# Altium footprint library EwgPassive.pcblib: 60 footprints (part 3 of 4)
Each footprint in its own frame and in the unit in brackets; x right, y up, seen from the top. Pads: shape width x height; smd on the part's side, far side on the other; paste and mask are expansions set on the pad; w line width, h text height; cw(c..) or ccw(c..) is an arc to the next point about the centre after c.
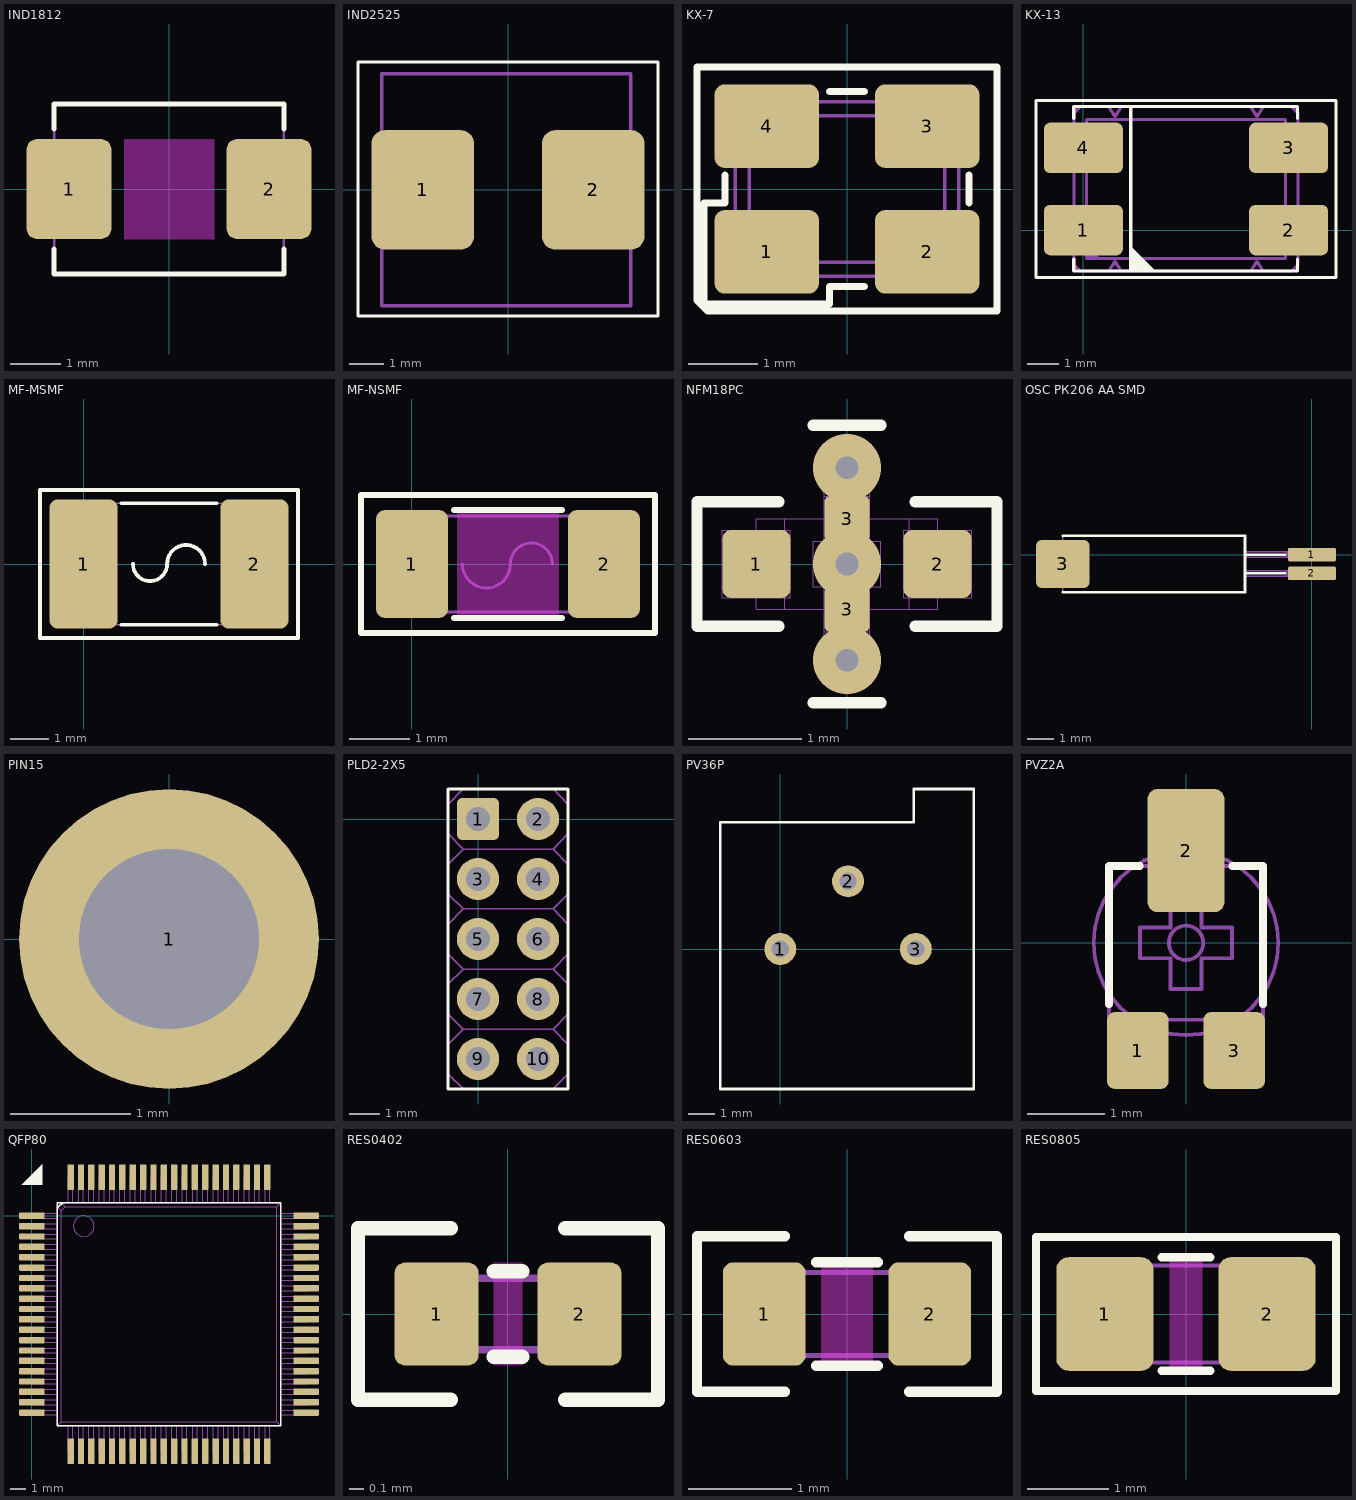
[diagram p2: the footprints below, top view; thin cyan lines are the x and y axes]

## IND1812 [mm]
pads (2):
  rrect25% 1.7x2 smd: 1(-2,0) 2(2,0)
Top Layer keep-out:
  region: -0.9,-1 0.9,-1 0.9,1 -0.9,1
Top Overlay:
  lines w0.1: -2.3,-1.2 -2.3,-1.7 2.3,-1.7 2.3,-1.2 ; -2.3,1.2 -2.3,1.7 2.3,1.7 2.3,1.2
Mechanical 1:
  lines w0.05: -2.3,-1.7 -2.3,1.7 2.3,1.7 2.3,-1.7 -2.3,-1.7
3D body: height 3.3, standoff 0.1, extent -2.262,-1.559 2.238,1.641

## IND2525 [mm]
pads (2):
  rrect25% 3x3.5 smd: 1(-2.5,0) 2(2.5,0)
Top Overlay:
  lines w0.1: -4.4,-3.7 4.4,-3.7 4.4,3.75 -4.4,3.75 -4.4,-3.7
Mechanical 1:
  lines w0.1: -3.7,-3.4 -3.7,3.4 3.6,3.4 3.6,-3.4 -3.7,-3.4
3D body: height 4.99, standoff 0.1, extent -3.68,-3.386 3.6,3.386

## KX-7 [mm]
pads (4):
  rrect25% 1.5x1.2 smd: 1(-1.15,-0.9) 2(1.15,-0.9) 3(1.15,0.9) 4(-1.15,0.9)
Top Overlay:
  lines w0.1: -1.75,0.2 -1.75,-0.2 -2.05,-0.2 -2.05,-1.65 -0.5,-1.65 -0.25,-1.65 -0.25,-1.4 0.25,-1.4 ; -0.25,1.4 0.25,1.4 ; 1.75,-0.2 1.75,0.2 ; -2.15,-1.6 -2.15,1.75 2.15,1.75 2.15,-1.75 -2,-1.75 -2.15,-1.6
Mechanical 1:
  region: -1.4,-0.65 -1.4,-1.05 -1,-1.05
  lines w0.05: -1.6,-1.25 -1.6,1.25 1.6,1.25 1.6,-1.25 -1.6,-1.25 ; -1.4,-1.05 -1.4,1.05 1.4,1.05 1.4,-1.05 -1.4,-1.05
3D body: height 1.21, standoff 0, extent -1.6,-1.25 1.6,1.25

## KX-13 [mm]
pads (4):
  rrect25% 2.5x1.6 smd: 1(0,0) 2(6.5,0) 3(6.5,2.6) 4(0,2.6)
Top Overlay:
  region: 2.311,-1.321 1.499,-0.508 1.499,-1.321
  lines w0.1: -0.305,-0.914 -0.305,-1.295 6.782,-1.295 6.782,-0.914 ; -0.305,3.531 -0.305,3.912 6.782,3.912 6.782,3.531 ; 1.499,-1.295 1.499,3.912 ; -1.5,-1.5 -1.5,4.1 8,4.1 8,-1.5 -1.5,-1.5
Mechanical 1:
  region: 0.102,-0.457 0.102,-0.864 0.508,-0.864
  lines w0.1: -0.3,-0.2 0,0 -0.3,0.2 ; -0.3,2.4 0,2.6 -0.3,2.8 ; -0.1,3.9 -0.3,3.7 -0.3,-1.1 -0.1,-1.3 6.6,-1.3 6.8,-1.1 6.8,3.7 6.6,3.9 ; -0.076,3.912 6.579,3.912 ; 0.8,-1.3 1,-1 1.2,-1.3 ; 0.8,3.9 1,3.6 1.2,3.9 ; 5.3,-1.3 5.5,-1 5.7,-1.3 ; 5.3,3.9 5.5,3.6 5.7,3.9 ; 6.8,-0.2 6.5,0 6.8,0.2 ; 6.8,2.4 6.5,2.6 6.8,2.8 ; 0.1,-0.9 6.4,-0.9 6.4,3.5 0.1,3.5 0.1,-0.9
3D body: height 1.31, standoff 0, extent -0.225,-1.2 6.775,3.8

## MF-MSMF [mm]
pads (2):
  rrect25% 1.8x3.4 smd: 1(0,0) 2(4.5,0)
Top Overlay:
  lines w0.1: 1,-1.6 3.5,-1.6 ; 1,1.6 3.5,1.6 ; 1.3,0 ccw(c1.75,0) 2.2,0 cw(c2.7,0) 3.2,0 ; -1.15,-1.95 5.65,-1.95 5.65,1.95 -1.15,1.95 -1.15,-1.95
Mechanical 1:
  lines w0.05: 0.6,-1.6 0.6,1.6 ; 3.9,-1.6 3.9,1.6 ; 0,-1.6 0,-0.4 ccw(c0,0) 0,0.4 0,1.6 4.5,1.6 4.5,0.4 ccw(c4.5,0) 4.5,-0.4 4.5,-1.6 0,-1.6
  text "FUSE" at 0.9,-0.6 h0.63
3D body: height 0.7, standoff 0, extent 0,-1.6 4.5,1.6

## MF-NSMF [mm]
pads (2):
  rrect25% 1.2x1.8 smd: 1(0,0) 2(3.2,0)
Top Layer keep-out:
  region: 0.75,-0.9 2.45,-0.9 2.45,0.9 0.75,0.9
Top Overlay:
  lines w0.1: 0.7,-0.9 2.5,-0.9 ; 0.7,0.9 2.5,0.9 ; -0.85,-1.15 -0.85,1.15 4.05,1.15 4.05,-1.15 -0.85,-1.15
Mechanical 1:
  lines w0.05: 0.5,-0.8 0.5,0.8 ; 0.84,0 ccw(c1.24,0) 1.64,0 cw(c1.99,0) 2.34,0 ; 2.7,-0.8 2.7,0.8 ; 0,-0.8 0,0.8 3.2,0.8 3.2,-0.8 0,-0.8
3D body: height 0.7, standoff 0, extent 0,-0.825 3.2,0.775

## NFM18PC [mm]
height 0.6
pads (4):
  rrect25% 0.6x0.6 smd: 1(-0.8,0) 2(0.8,0)
  rrect25% 0.4x0.4 smd mask+0.05: 3(0,-0.4) 3(0,0.4)
via 0,-0.85 diameter 0.6 hole 0.2
via 0,0.85 diameter 0.6 hole 0.2
via 0,0 diameter 0.6 hole 0.2
Top Overlay:
  lines w0.1: -0.6,-0.55 -1.325,-0.55 -1.325,0.55 -0.6,0.55 ; -0.3,-1.225 0.3,-1.225 ; -0.3,1.225 0.3,1.225 ; 0.6,-0.55 1.325,-0.55 1.325,0.55 0.6,0.55
Mechanical 1:
  circle w0.01: c0,0.75 r0.125
  circle w0.01: c0,-0.75 r0.125
  circle w0.01: c0,0 r0.125
  lines w0.01: -0.55,-0.4 -0.55,0.4 ; -0.201,-0.6 0.203,-0.6 ; -0.2,-0.4 -0.2,0.4 ; -0.2,0.6 0.2,0.6 ; 0.2,-0.4 0.2,0.4 ; 0.55,-0.4 0.55,0.4 ; -1.1,-0.3 -1.1,0.3 -0.5,0.3 -0.5,-0.3 -1.1,-0.3 ; -0.8,-0.4 0.8,-0.4 0.8,0.4 -0.8,0.4 -0.8,-0.4 ; -0.3,-0.2 0.3,-0.2 0.3,0.2 -0.3,0.2 -0.3,-0.2 ; -0.2,-1 0.2,-1 0.2,1 -0.2,1 -0.2,-1 ; 0.5,-0.3 1.1,-0.3 1.1,0.3 0.5,0.3 0.5,-0.3
3D body: height 0.6, standoff 0, extent -0.8,-0.4 0.8,0.4

## OSC РК206 AA SMD [mm]
pads (3):
  rrect25% 1.8x0.5 smd: 1(0,0) 2(0,-0.7)
  rrect25% 2x1.8 smd: 3(-9.3,-0.35)
Top Overlay:
  lines w0.1: -9.3,-1.4 -2.5,-1.4 -2.5,0.7 -9.3,0.7 ; -2.5,-0.7 -1,-0.7 ; -2.5,0 -1,0
Mechanical 1:
  lines w0.05: -2.5,-0.8 -1,-0.8 ; -2.5,-0.6 0,-0.6 0,-0.8 -1,-0.8 ; -2.5,-0.1 -1,-0.1 ; -2.5,0.1 0,0.1 0,-0.1 -1,-0.1 ; -1,-0.6 cw(c-1,-0.7) -1,-0.8 ; -1,0.1 cw(c-1,0) -1,-0.1 ; -9.3,-1.4 -9.3,0.7 -2.5,0.7 -2.5,-1.4 -9.3,-1.4
3D body: height 2.03, standoff 0, extent -9.3,-1.355 0,0.675

## PIN15 [mm]
pads (1):
  round 2.5 hole 1.5: 1(0,0)

## PLD2-2X5 [mm]
pads (10):
  rrect25% 1.4x1.4 hole 0.8: 1(0,0)
  round 1.4 hole 0.8: 2(2,0) 3(0,-2) 4(2,-2) 5(0,-4) 6(2,-4) 7(0,-6) 8(2,-6) 9(0,-8) 10(2,-8)
Top Overlay:
  lines w0.1: -1,-9 3,-9 3,1 -1,1 -1,-9
Mechanical 1:
  lines w0.05: -0.5,-7 2.5,-7 ; -0.5,-7 -1,-7.5 -1,-8.5 -0.5,-9 2.5,-9 3,-8.5 3,-7.5 2.5,-7 ; -0.5,-7 -1,-6.5 -1,-5.5 -0.5,-5 ; -0.5,-7 2.5,-7 ; -0.5,-5 -1,-4.5 -1,-3.5 -0.5,-3 ; -0.5,-5 2.5,-5 ; -0.5,-5 2.5,-5 ; -0.5,-3 2.5,-3 ; -0.5,-3 -1,-2.5 -1,-1.5 -0.5,-1 ; -0.5,-3 2.5,-3 ; -0.5,-1 2.5,-1 ; -0.5,-1 -1,-0.5 -1,0.5 -0.5,1 2.5,1 3,0.5 3,-0.5 2.5,-1 ; -0.5,-1 2.5,-1 ; 2.5,-7 3,-6.5 3,-5.5 2.5,-5 ; 2.5,-5 3,-4.5 3,-3.5 2.5,-3 ; 2.5,-3 3,-2.5 3,-1.5 2.5,-1

## PV36P [mm] "Couple rate"
pads (3):
  round 1.2 hole 0.65: 1(0,0) 2(2.54,2.54) 3(5.08,0)
Top Overlay:
  lines w0.1: 6.25,6 7.25,6 ; 7.25,6 7.25,-5.25 -2.25,-5.25 -2.25,4.75 5,4.75 5,6 7.25,6
3D body: height 5.2, standoff -2, extent -2.25,-5.2 7.25,6.1

## PVZ2A [mm]
pads (3):
  rrect25% 0.8x1 smd: 1(-0.625,-1.4) 3(0.625,-1.4)
  rrect25% 1x1.6 smd: 2(0,1.2)
Top Overlay:
  lines w0.1: -1,-0.8 -1,1 -0.6,1 ; 0.6,1 1,1 1,-0.8
Mechanical 1:
  circle w0.05: c0,0 r0.224
  circle w0.05: c0,0 r1.2
  lines w0.05: -0.9,-1 -0.9,-1.5 -0.35,-1.5 -0.35,-1 ; -0.4,1 -0.4,1.5 0.4,1.5 0.4,1 ; 0.35,-1 0.35,-1.5 0.9,-1.5 0.9,-1 ; -1,-1 1,-1 1,1 -1,1 -1,-1 ; -0.6,-0.2 -0.2,-0.2 -0.2,-0.6 0.2,-0.6 0.2,-0.2 0.6,-0.2 0.6,0.2 0.2,0.2 0.2,0.6 -0.2,0.6 -0.2,0.2 -0.6,0.2 -0.6,-0.2
3D body: height 0.9, standoff 0, extent -1.05,-1.425 1.05,1.275

## QFP80 [mm]
pads (80):
  rrect25% 1.6x0.4 smd: 1(0,0) 2(0,-0.65) 3(0,-1.3) 4(0,-1.95) 5(0,-2.6) 6(0,-3.25) 7(0,-3.9) 8(0,-4.55) 9(0,-5.2) 10(0,-5.85) 11(0,-6.5) 12(0,-7.15) 13(0,-7.8) 14(0,-8.45) 15(0,-9.1) 16(0,-9.75) 17(0,-10.4) 18(0,-11.05) 19(0,-11.7) 20(0,-12.35) 41(17.2,-12.35) 42(17.2,-11.7) 43(17.2,-11.05) 44(17.2,-10.4) 45(17.2,-9.75) 46(17.2,-9.1) 47(17.2,-8.45) 48(17.2,-7.8) 49(17.2,-7.15) 50(17.2,-6.5) 51(17.2,-5.85) 52(17.2,-5.2) 53(17.2,-4.55) 54(17.2,-3.9) 55(17.2,-3.25) 56(17.2,-2.6) 57(17.2,-1.95) 58(17.2,-1.3) 59(17.2,-0.65) 60(17.2,0)
  rrect25% 0.4x1.6 smd: 21(2.425,-14.775) 22(3.075,-14.775) 23(3.725,-14.775) 24(4.375,-14.775) 25(5.025,-14.775) 26(5.675,-14.775) 27(6.325,-14.775) 28(6.975,-14.775) 29(7.625,-14.775) 30(8.275,-14.775) 31(8.925,-14.775) 32(9.575,-14.775) 33(10.225,-14.775) 34(10.875,-14.775) 35(11.525,-14.775) 36(12.175,-14.775) 37(12.825,-14.775) 38(13.475,-14.775) 39(14.125,-14.775) 40(14.775,-14.775) 61(14.775,2.425) 62(14.125,2.425) 63(13.475,2.425) 64(12.825,2.425) 65(12.175,2.425) 66(11.525,2.425) 67(10.875,2.425) 68(10.225,2.425) 69(9.575,2.425) 70(8.925,2.425) 71(8.275,2.425) 72(7.625,2.425) 73(6.975,2.425) 74(6.325,2.425) 75(5.675,2.425) 76(5.025,2.425) 77(4.375,2.425) 78(3.725,2.425) 79(3.075,2.425) 80(2.425,2.425)
Top Overlay:
  region: 0.65,1.95 0.65,3.25 -0.65,1.95
  lines w0.1: 1.6,0.5 1.925,0.825 ; 1.6,-13.175 1.6,0.825 15.6,0.825 15.6,-13.175 1.6,-13.175
Mechanical 1:
  drawing of 416 lines, arcs and shapes, not listed

## RES0402 [mm]
pads (2):
  rrect25% 0.59x0.72 smd: 1(-0.5,0) 2(0.5,0)
Top Layer keep-out:
  region: -0.1,0.36 -0.1,-0.36 0.1,-0.36 0.1,0.36
Top Overlay:
  lines w0.1: -0.4,-0.6 -1.05,-0.6 -1.05,0.6 -0.4,0.6 ; -0.1,-0.3 0.1,-0.3 ; -0.1,0.3 0.1,0.3 ; 0.4,-0.6 1.05,-0.6 1.05,0.6 0.4,0.6
Mechanical 1:
  lines w0.05: -0.3,0.25 -0.3,-0.25 -0.5,-0.25 ; 0.3,-0.25 0.3,0.25 ; -0.5,-0.25 -0.5,0.25 0.5,0.25 0.5,-0.25 -0.5,-0.25
3D body: height 0.33, standoff -0.03, extent -0.5,-0.25 0.5,0.25

## RES0603 [mm]
pads (2):
  rrect25% 0.8x1 smd: 1(-0.8,0) 2(0.8,0)
Top Layer keep-out:
  region: -0.25,0.5 -0.25,-0.5 0.25,-0.5 0.25,0.5
Top Overlay:
  lines w0.1: -0.6,-0.75 -1.45,-0.75 -1.45,0.75 -0.6,0.75 ; -0.3,-0.5 0.3,-0.5 ; -0.3,0.5 0.3,0.5 ; 0.6,-0.75 1.45,-0.75 1.45,0.75 0.6,0.75
Mechanical 1:
  lines w0.05: -0.5,-0.4 -0.5,0.4 ; 0.5,-0.4 0.5,0.4 ; -0.8,-0.4 -0.8,0.4 0.8,0.4 0.8,-0.4 -0.8,-0.4
3D body: height 0.51, standoff 0, extent -0.775,-0.425 0.775,0.425

## RES0805 [mm]
pads (2):
  rrect25% 1.2x1.4 smd: 1(-1,0) 2(1,0)
Top Layer keep-out:
  region: -0.2,-0.7 0.2,-0.7 0.2,0.7 -0.2,0.7
Top Overlay:
  lines w0.1: -0.3,-0.7 0.3,-0.7 ; -0.3,0.7 0.3,0.7 ; -1.85,-0.95 1.85,-0.95 1.85,0.95 -1.85,0.95 -1.85,-0.95
Mechanical 1:
  lines w0.05: -0.5,-0.6 -0.5,0.6 ; 0.5,-0.6 0.5,0.6 ; -1,-0.6 -1,0.6 1,0.6 1,-0.6 -1,-0.6
3D body: height 0.51, standoff 0, extent -1,-0.625 1,0.625